# Altium footprint library PcbLib2_Iot_source.PcbLib: 61 footprints (part 4 of 4)
Each footprint in its own frame and in the unit in brackets; x right, y up, seen from the top. Pads: shape width x height; smd on the part's side, far side on the other; paste and mask are expansions set on the pad; w line width, h text height; cw(c..) or ccw(c..) is an arc to the next point about the centre after c.
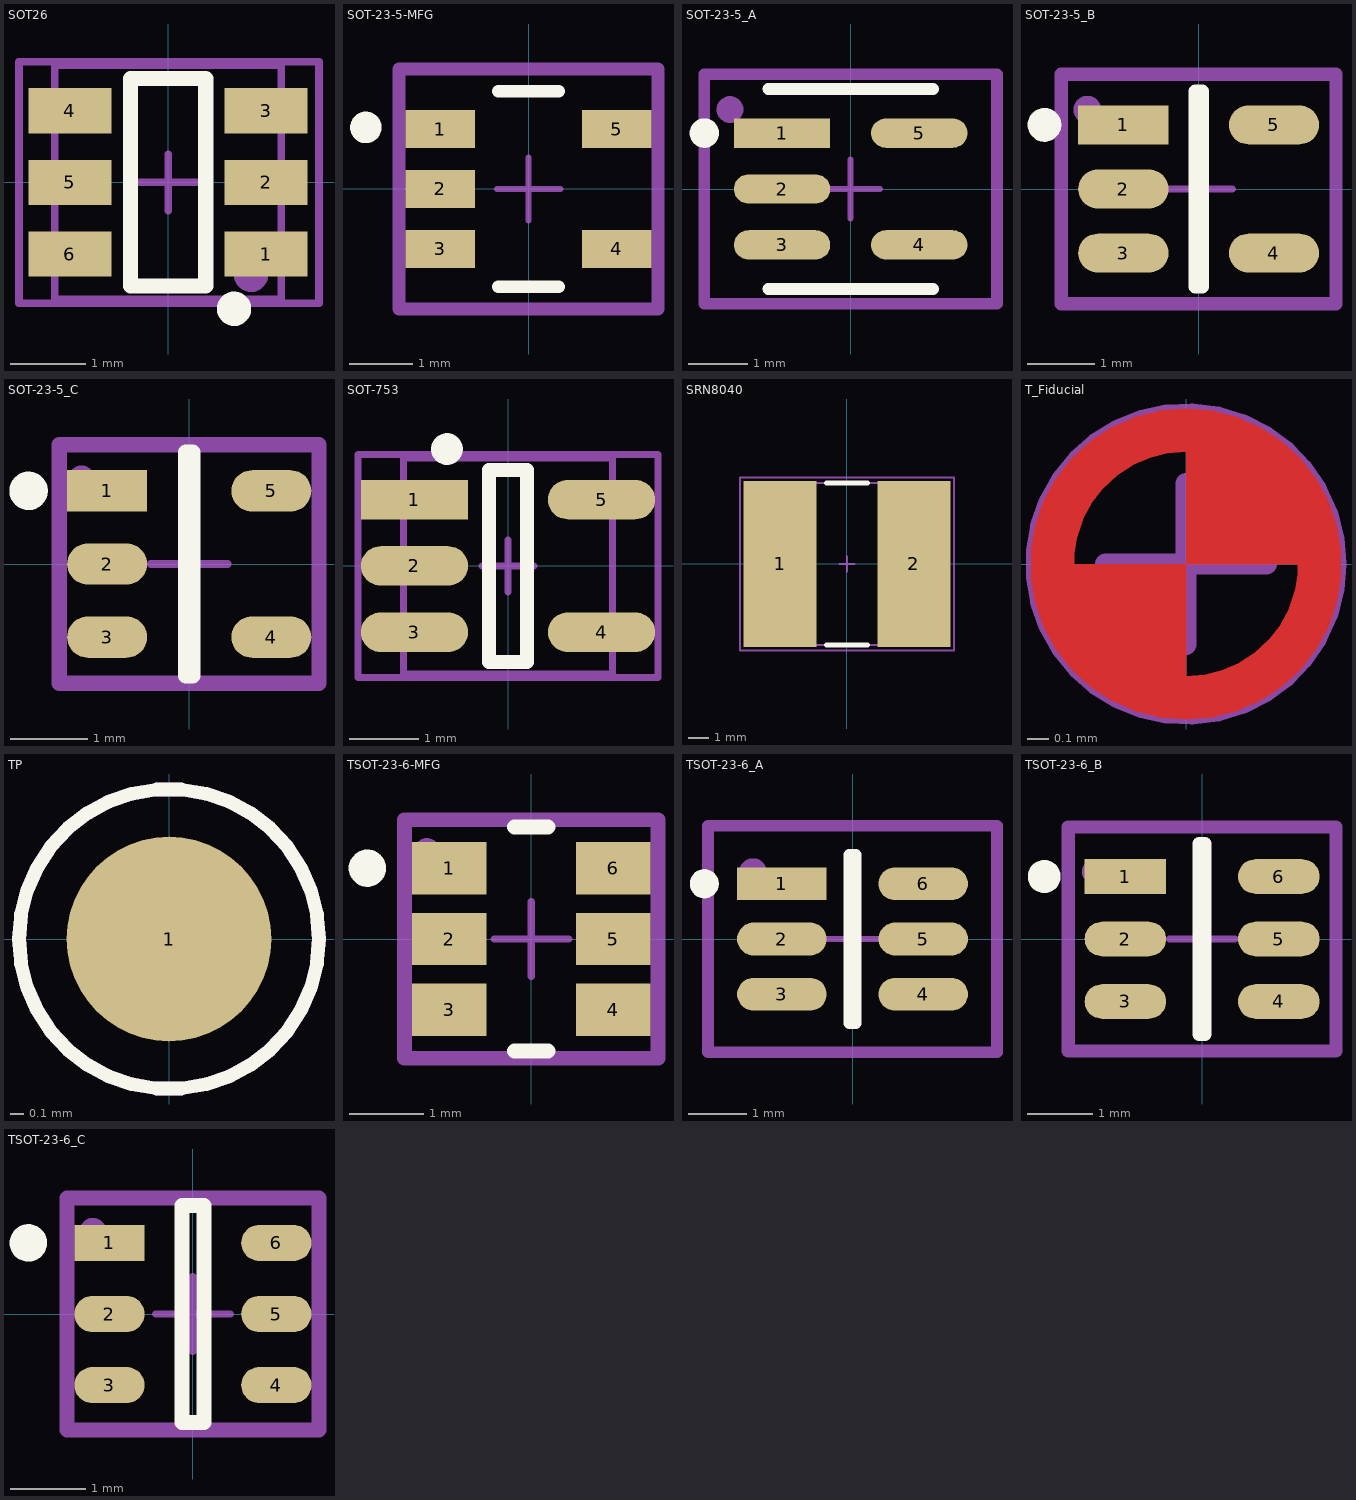
[diagram p3: the footprints below, top view; thin cyan lines are the x and y axes]

## SOT26 [mm]
pads (6):
  rect 1.1x0.6 smd: 1(1.3,-0.95) 2(1.3,0) 3(1.3,0.95) 4(-1.3,0.95) 5(-1.3,0) 6(-1.3,-0.95)
Top Overlay:
  circle w0.254: c0.875,-1.675 r0.1
  lines w0.2: -0.5,-1.375 -0.5,1.375 0.5,1.375 0.5,-1.375 -0.5,-1.375
Top Assembly:
  circle w0.254: c1.1,-1.225 r0.1
  lines w0.1: -1.5,-1.55 -1.5,1.55 1.5,1.55 1.5,-1.55 -1.5,-1.55
  text "'.Designator'" at 0.35,-0.85 h1.2
Mechanical:
  lines w0.1: -0.375,0 0.375,0 ; 0,-0.375 0,0.375 ; -1.975,-1.6 2,-1.6 2,1.6 -1.975,1.6 -1.975,-1.6
3D body "SOT26_DIO.step": height 1.4, standoff 0, extent -1.499,-1.549 1.499,1.549

## SOT-23-5-MFG [mm]
pads (5):
  rect 1.1x0.6 smd paste+0 mask+0: 1(-1.4,0.95) 2(-1.4,0) 3(-1.4,-0.95) 4(1.4,-0.95) 5(1.4,0.95)
Top Overlay:
  circle w0.25: c-2.575,0.975 r0.125
  lines w0.2: -0.475,-1.55 0.475,-1.55 ; -0.475,1.55 0.475,1.55
Top Assembly:
  lines w0.2: -2.05,-1.9 2.05,-1.9 2.05,1.9 -2.05,1.9 -2.05,-1.9
  text ".Designator" at 0,0 h1
Mechanical:
  lines w0.1: -0.5,0 0.5,0 ; 0,-0.5 0,0.5
  lines w0.2: -2.05,-1.9 2.05,-1.9 2.05,1.9 -2.05,1.9 -2.05,-1.9
3D body "MCP73831T-2ACI_OT.step": height 1.45, standoff 0, extent -1.35,-1.45 1.35,1.45

## SOT-23-5_A [mm]
pads (5):
  rect 1.638x0.5 smd paste+0 mask+0: 1(-1.166,0.95)
  rrect100% 1.638x0.5 smd paste+0 mask+0: 2(-1.166,0) 3(-1.166,-0.95) 4(1.166,-0.95) 5(1.166,0.95)
Top Overlay:
  circle w0.25: c-2.485,0.95 r0.125
  lines w0.2: -1.4,-1.7 1.4,-1.7 ; -1.4,1.7 1.4,1.7
Top Assembly:
  circle w0.254: c-2.05,1.35 r0.1
  lines w0.2: -2.485,-1.95 -2.485,1.95 2.485,1.95 2.485,-1.95 -2.485,-1.95
  text ".Designator" at 0,0.188 h1
Mechanical:
  lines w0.1: -0.5,0 0.5,0 ; 0,-0.5 0,0.5
  lines w0.2: -2.485,-1.95 -2.485,1.95 2.485,1.95 2.485,-1.95 -2.485,-1.95
3D body "MCP73831T-2ACI_OT.step": height 1.45, standoff 0, extent -1.35,-1.45 1.35,1.45

## SOT-23-5_B [mm]
pads (5):
  rect 1.338x0.578 smd paste+0 mask+0: 1(-1.116,0.95)
  rrect100% 1.338x0.578 smd paste+0 mask+0: 2(-1.116,0) 3(-1.116,-0.95) 4(1.116,-0.95) 5(1.116,0.95)
Top Overlay:
  circle w0.25: c-2.285,0.95 r0.125
  lines w0.2: -0.053,-1.45 -0.053,1.45 0.053,1.45 0.053,-1.45 -0.053,-1.45
Top Assembly:
  circle w0.254: c-1.65,1.175 r0.079
  lines w0.2: -2.035,-1.7 2.035,-1.7 2.035,1.7 -2.035,1.7 -2.035,-1.7
  text ".Designator" at 0,0.188 h1
Mechanical:
  lines w0.1: -0.5,0 0.5,0 ; 0,-0.5 0,0.5
  lines w0.2: -2.035,-1.7 2.035,-1.7 2.035,1.7 -2.035,1.7 -2.035,-1.7
3D body "MCP73831T-2ACI_OT.step": height 1.45, standoff 0, extent -1.35,-1.45 1.35,1.45

## SOT-23-5_C [mm]
pads (5):
  rect 1.038x0.538 smd paste+0 mask+0: 1(-1.066,0.95)
  rrect100% 1.038x0.538 smd paste+0 mask+0: 2(-1.066,0) 3(-1.066,-0.95) 4(1.066,-0.95) 5(1.066,0.95)
Top Overlay:
  circle w0.25: c-2.085,0.95 r0.125
  lines w0.2: -0.047,-1.45 0.047,-1.45 0.047,1.45 -0.047,1.45 -0.047,-1.45
Top Assembly:
  circle w0.254: c-1.4,1.1 r0.05
  lines w0.2: -1.685,-1.55 1.685,-1.55 1.685,1.55 -1.685,1.55 -1.685,-1.55
  text ".Designator" at 0,0.188 h1
Mechanical:
  lines w0.1: -0.5,0 0.5,0 ; 0,-0.5 0,0.5
  lines w0.2: -1.685,-1.55 1.685,-1.55 1.685,1.55 -1.685,1.55 -1.685,-1.55
3D body "MCP73831T-2ACI_OT.step": height 1.45, standoff 0, extent -1.35,-1.45 1.35,1.45

## SOT-753 [mm]
pads (5):
  rect 1.54x0.566 smd: 1(-1.341,0.95)
  rrect100% 1.54x0.566 smd: 2(-1.341,0) 3(-1.341,-0.95) 4(1.341,-0.95) 5(1.341,0.95)
Top Overlay:
  circle w0.254: c-0.875,1.675 r0.1
  lines w0.2: -0.275,-1.375 -0.275,1.375 0.275,1.375 0.275,-1.375 -0.275,-1.375
Top Assembly:
  lines w0.1: -1.5,-1.55 1.5,-1.55 1.5,1.55 -1.5,1.55 -1.5,-1.55
  text "'.Designator'" at -0.35,0.85 h1.2
Mechanical:
  lines w0.1: -0.375,0 0.375,0 ; 0,-0.375 0,0.375 ; -2.15,-1.6 2.15,-1.6 2.15,1.6 -2.15,1.6 -2.15,-1.6
3D body "User Library-SOT-23-5.STEP": height 1.46, standoff 0, extent -1.5,-1.475 1.5,1.525

## SRN8040 [mm]
pads (2):
  rect 3.6x8.2 smd: 1(-3.3,0) 2(3.3,0)
Top Overlay:
  lines w0.254: -1,-4 1,-4 ; -1,4 1,4
Top Assembly:
  lines w0.1: -4.025,-4 4.025,-4 4.025,4 -4.025,4 -4.025,-4
  text "'.Designator'" at -1.425,-0.55 h2
Mechanical:
  lines w0.1: -0.375,0 0.375,0 ; 0,-0.375 0,0.375 ; -5.275,-4.275 5.275,-4.275 5.275,4.275 -5.275,4.275 -5.275,-4.275
3D body "User Library-Inductor SRN8040 Series.step": height -1.8, standoff -5.8, extent -4.009,-4 4.009,4

## T_Fiducial [mm] "Fiducial"
Top Layer:
  region: 0,0 0,0.625 0.124,0.625 0.354,0.53 0.53,0.354 0.625,0.124 0.625,0
  region: 0,0 0,-0.625 -0.124,-0.625 -0.354,-0.53 -0.53,-0.354 -0.625,-0.124 -0.625,0
  lines w0.203: 0,-0.625 cw(c0,0) 0,0.625 cw(c0,0) 0,-0.625
Top Solder:
  circle w0.203: c0,0 r0.625
  region: 0,-0.625 -0.124,-0.625 -0.354,-0.53 -0.53,-0.354 -0.625,-0.124 -0.625,0 -0.625,0.124 -0.53,0.354 -0.354,0.53 -0.124,0.625 0,0.625 0.124,0.625 0.354,0.53 0.53,0.354 0.625,0.124 0.625,0 0.625,-0.124 0.53,-0.354 0.354,-0.53 0.124,-0.625
Mechanical:
  circle w0.1: c0,0 r0.7
  lines w0.1: -0.375,0 0.375,0 ; 0,-0.375 0,0.375

## TP [mm]
pads (1):
  round 1.5 smd mask+0.2: 1(0,0)
Top Overlay:
  circle w0.1: c0,0 r1.1
Top Assembly:
  circle w0.1: c0,0 r0.65
Mechanical:
  circle w0.1: c0,0 r1.1
  lines w0.1: -0.375,0 0.375,0 ; 0,-0.375 0,0.375

## TSOT-23-6-MFG [mm]
pads (6):
  rect 1x0.7 smd paste+0 mask+0: 1(-1.099,0.95) 2(-1.099,0) 3(-1.099,-0.95) 4(1.099,-0.95) 5(1.099,0) 6(1.099,0.95)
Top Overlay:
  circle w0.25: c-2.2,0.95 r0.125
  lines w0.2: -0.225,-1.5 0.225,-1.5 ; -0.225,1.5 0.225,1.5
Top Assembly:
  circle w0.254: c-1.4,1.175 r0.05
  lines w0.2: -1.699,-1.6 -1.699,1.6 1.699,1.6 1.699,-1.6 -1.699,-1.6
  text ".Designator" at 0,0.188 h1
Mechanical:
  lines w0.1: -0.5,0 0.5,0 ; 0,-0.5 0,0.5
  lines w0.2: -1.699,-1.6 1.699,-1.6 1.699,1.6 -1.699,1.6 -1.699,-1.6
3D body "IC_Diodes_Inc_AP63205WU-7_eec.STEP": height 0.25, standoff 0, extent -1.699,-1.6 1.699,1.6

## TSOT-23-6_A [mm]
pads (6):
  rect 1.54x0.566 smd paste+0 mask+0: 1(-1.216,0.95)
  rrect100% 1.54x0.566 smd paste+0 mask+0: 2(-1.216,0) 3(-1.216,-0.95) 4(1.216,-0.95) 5(1.216,0) 6(1.216,0.95)
Top Overlay:
  circle w0.25: c-2.55,0.95 r0.125
  lines w0.2: -0.054,-1.45 0.054,-1.45 0.054,1.45 -0.054,1.45 -0.054,-1.45
Top Assembly:
  circle w0.254: c-1.713,1.15 r0.112
  lines w0.2: -2.485,-1.95 -2.485,1.95 2.485,1.95 2.485,-1.95 -2.485,-1.95
  text ".Designator" at 0,0.188 h1
Mechanical:
  lines w0.1: -0.5,0 0.5,0 ; 0,-0.5 0,0.5
  lines w0.2: -2.485,-1.95 -2.485,1.95 2.485,1.95 2.485,-1.95 -2.485,-1.95
3D body "IC_Diodes_Inc_AP63205WU-7_eec.STEP": height 0.25, standoff 0, extent -2.485,-1.95 2.485,1.95

## TSOT-23-6_B [mm]
pads (6):
  rect 1.24x0.526 smd paste+0 mask+0: 1(-1.165,0.95)
  rrect100% 1.24x0.526 smd paste+0 mask+0: 2(-1.165,0) 3(-1.165,-0.95) 4(1.166,-0.95) 5(1.166,0) 6(1.166,0.95)
Top Overlay:
  circle w0.25: c-2.4,0.95 r0.125
  lines w0.2: -0.046,-1.45 -0.046,1.45 0.046,1.45 0.046,-1.45 -0.046,-1.45
Top Assembly:
  circle w0.254: c-1.65,1.025 r0.05
  lines w0.2: -2.035,-1.7 -2.035,1.7 2.035,1.7 2.035,-1.7 -2.035,-1.7
  text ".Designator" at 0,0.188 h1
Mechanical:
  lines w0.1: -0.5,0 0.5,0 ; 0,-0.5 0,0.5
  lines w0.2: -2.035,-1.7 -2.035,1.7 2.035,1.7 2.035,-1.7 -2.035,-1.7
3D body "IC_Diodes_Inc_AP63205WU-7_eec.STEP": height 0.25, standoff 0, extent -2.035,-1.7 2.035,1.7

## TSOT-23-6_C [mm]
pads (6):
  rect 0.94x0.486 smd paste+0 mask+0: 1(-1.115,0.95)
  rrect100% 0.94x0.486 smd paste+0 mask+0: 2(-1.115,0) 3(-1.115,-0.95) 4(1.116,-0.95) 5(1.116,0) 6(1.116,0.95)
Top Overlay:
  circle w0.25: c-2.2,0.95 r0.125
  lines w0.2: -0.146,-1.45 0.146,-1.45 0.146,1.45 -0.146,1.45 -0.146,-1.45
Top Assembly:
  circle w0.254: c-1.338,1.1 r0.056
  lines w0.2: -1.685,-1.55 1.685,-1.55 1.685,1.55 -1.685,1.55 -1.685,-1.55
  text ".Designator" at 0,0.188 h1
Mechanical:
  lines w0.1: -0.5,0 0.5,0 ; 0,-0.5 0,0.5
  lines w0.2: -1.685,-1.55 -1.685,1.55 1.685,1.55 1.685,-1.55 -1.685,-1.55
3D body "IC_Diodes_Inc_AP63205WU-7_eec.STEP": height 0.25, standoff 0, extent -1.685,-1.55 1.685,1.55